# Altium footprint library ic.PcbLib: 106 footprints (part 5 of 7)
Each footprint in its own frame and in the unit in brackets; x right, y up, seen from the top. Pads: shape width x height; smd on the part's side, far side on the other; paste and mask are expansions set on the pad; w line width, h text height; cw(c..) or ccw(c..) is an arc to the next point about the centre after c.
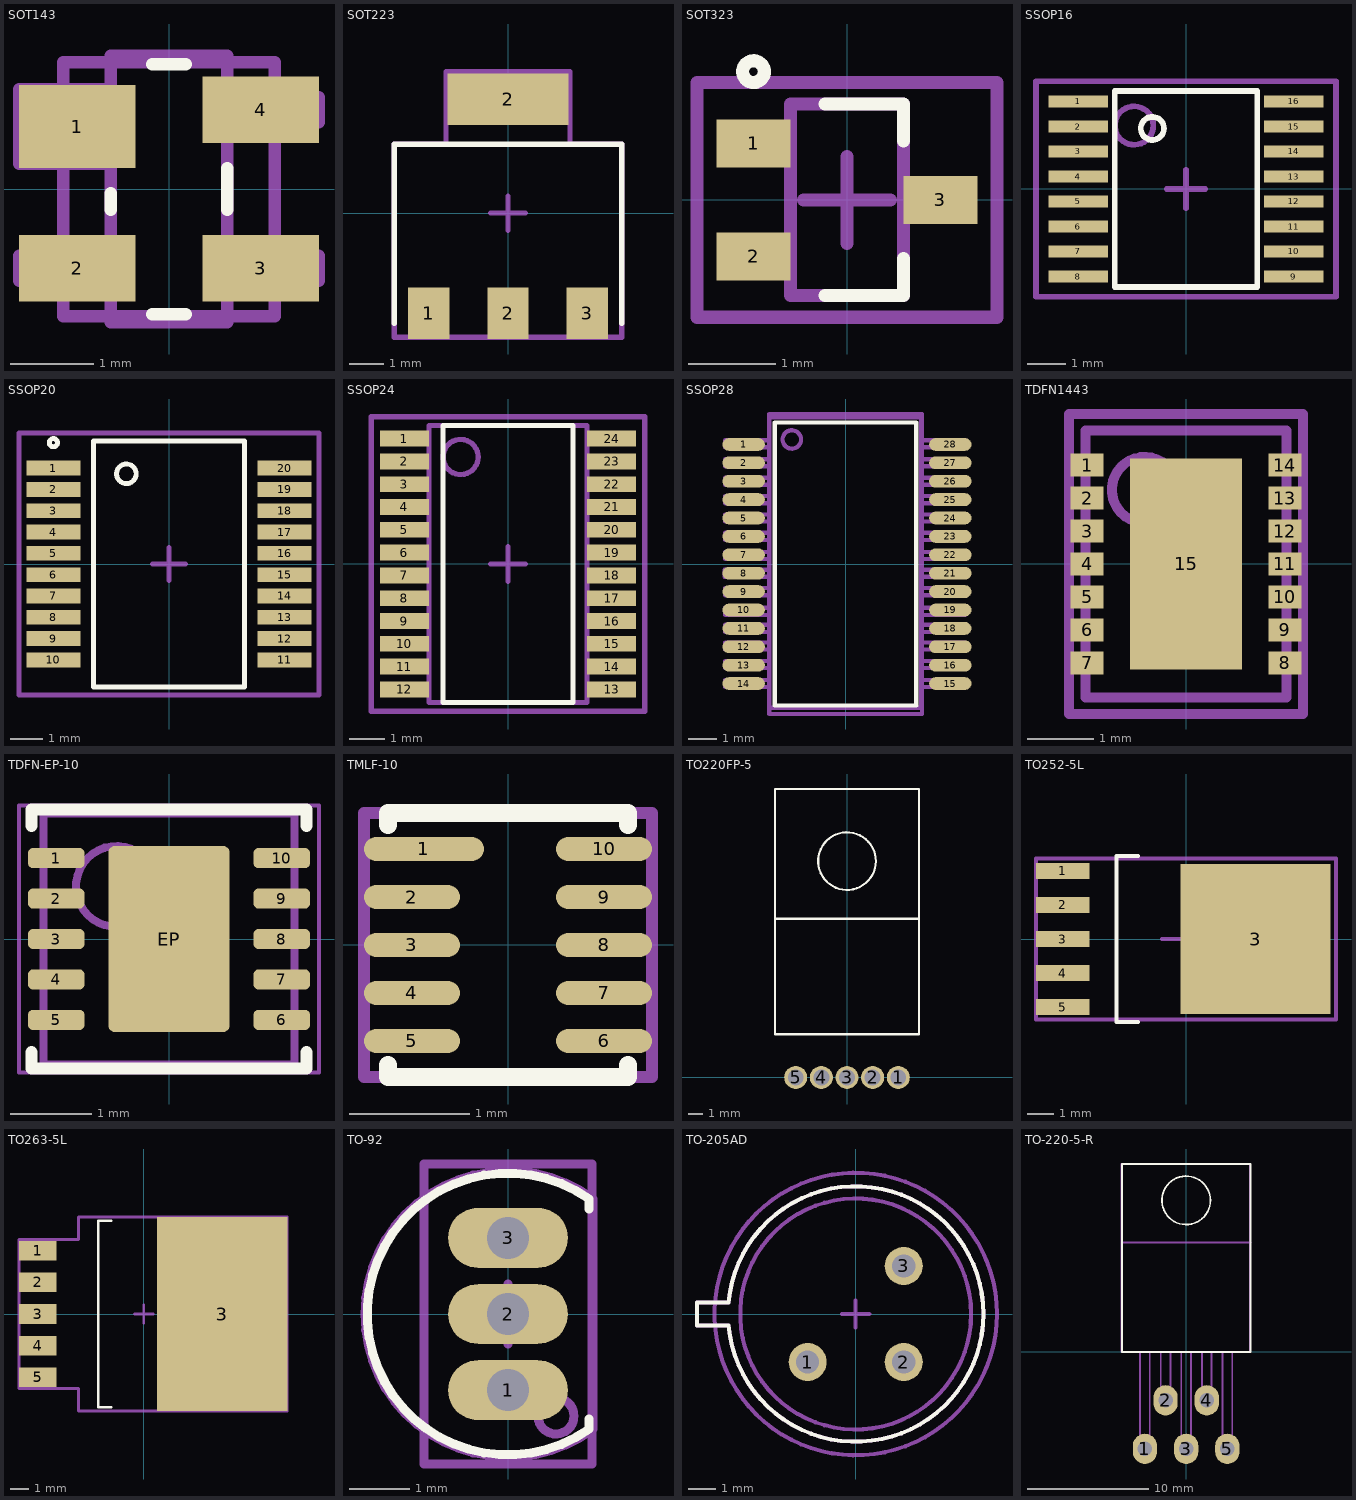
[diagram p4: the footprints below, top view; thin cyan lines are the x and y axes]

## SOT143 [mm] "SOT143, 4-Leads, Body 2,92x2,37mm, Pitch 1,90mm, IPC High Density"
height 1.2
pads (4):
  rect 1.4x1 smd: 1(-1.1,0.75)
  rect 1.4x0.8 smd: 2(-1.1,-0.95) 3(1.1,-0.95) 4(1.1,0.95)
Top Overlay:
  lines w0.15: -0.7,-0.25 -0.7,-0.05 ; -0.2,-1.5 0.2,-1.5 ; -0.2,1.5 0.2,1.5 ; 0.7,-0.25 0.7,0.25
  text "." at -1.651,1.816 h0.1
Top Courtyard:
  lines w0.15: -1.27,-1.524 1.27,-1.524 1.27,1.524 -1.27,1.524 -1.27,-1.524
Mechanical 29:
  lines w0.15: -0.7,-1.1 -1.8,-1.1 -1.8,-0.8 -0.7,-0.8 ; -0.7,0.3 -1.8,0.3 -1.8,1.2 -0.7,1.2 ; 0.7,-1.1 1.8,-1.1 1.8,-0.8 0.7,-0.8 ; 0.7,0.8 1.8,0.8 1.8,1.1 0.7,1.1 ; -0.7,-1.6 0.7,-1.6 0.7,1.6 -0.7,1.6 -0.7,-1.6
  text ".Designator" at -1.8,2 h1
3D body "SOT143.step": height 1.2, standoff 0.01, extent -1.179,-1.52 1.179,1.52

## SOT223 [mm]
pads (4):
  rect 1.2x1.5 smd: 1(-2.3,-2.9) 2(0,-2.9) 3(2.3,-2.9)
  rect 3.5x1.5 smd: 2(0,3.3)
Top Overlay:
  lines w0.15: -3.3,-3.2 -3.3,2 0,2 3.3,2 3.3,-3.2
  text "." at -3.6,-3.7 h0.1
Top Courtyard:
  lines w0.15: -0.5,0 0.5,0 ; 0,-0.5 0,0.5 ; -3.3,-3.6 3.3,-3.6 3.3,-2.6 3.3,2 1.8,2 1.8,4.1 -1.8,4.1 -1.8,2 -3.3,2 -3.3,-3.6
3D body "SW3dPS-SOT-223-1.STEP": height 1.64, standoff -0.01, extent -3.25,-3.398 3.25,3.602

## SOT323 [mm] "SOT323, 3-Leads, Body 2,00x2,10mm, Pitch 0,65mm, IPC Medium Density"
height 1.1
pads (3):
  rect 0.85x0.55 smd: 1(-1.075,0.65) 2(-1.075,-0.65) 3(1.075,0)
Top Overlay:
  circle w0.15: c-1.075,1.475 r0.125
  lines w0.15: -0.25,-1.1 0.65,-1.1 0.65,-0.675 ; -0.25,1.1 0.65,1.1 0.65,0.675
Top Courtyard:
  lines w0.15: -0.5,0 0.5,0 ; 0,-0.5 0,0.5 ; -1.725,-1.35 1.725,-1.35 1.725,1.35 -1.725,1.35 -1.725,-1.35
Mechanical 13:
  lines w0.15: -0.65,-1.1 0.65,-1.1 0.65,1.1 -0.65,1.1 -0.65,-1.1
3D body: height 1.1, standoff 0.1, extent -0.65,-1.1 0.65,1.1

## SSOP16 [mm]
height 1.2
pads (16):
  rect 1.55x0.3 smd: 1(-2.8,2.275) 2(-2.8,1.625) 3(-2.8,0.975) 4(-2.8,0.325) 5(-2.8,-0.325) 6(-2.8,-0.975) 7(-2.8,-1.625) 8(-2.8,-2.275) 9(2.8,-2.275) 10(2.8,-1.625) 11(2.8,-0.975) 12(2.8,-0.325) 13(2.8,0.325) 14(2.8,0.975) 15(2.8,1.625) 16(2.8,2.275)
Top Overlay:
  circle w0.15: c-0.875,1.575 r0.3
  lines w0.15: -1.85,-2.55 -1.85,2.55 1.85,2.55 1.85,-2.55 -1.85,-2.55
  text "." at -2.8,2.9 h0.1
Top Courtyard:
  lines w0.15: -0.5,0 0.5,0 ; 0,-0.5 0,0.5 ; -3.9,-2.8 -3.9,2.8 3.9,2.8 3.9,-2.8 -3.9,-2.8
Mechanical 13:
  circle w0.15: c-1.35,1.65 r0.5

## SSOP20 [mm] "SOP, 20-Leads, Body 7,20x5,29mm, Pitch 0,65mm, IPC Medium Density"
height 1.98
pads (20):
  rect 1.65x0.45 smd: 1(-3.525,2.925) 2(-3.525,2.275) 3(-3.525,1.625) 4(-3.525,0.975) 5(-3.525,0.325) 6(-3.525,-0.325) 7(-3.525,-0.975) 8(-3.525,-1.625) 9(-3.525,-2.275) 10(-3.525,-2.925) 11(3.525,-2.925) 12(3.525,-2.275) 13(3.525,-1.625) 14(3.525,-0.975) 15(3.525,-0.325) 16(3.525,0.325) 17(3.525,0.975) 18(3.525,1.625) 19(3.525,2.275) 20(3.525,2.925)
Top Overlay:
  circle w0.15: c-3.525,3.7 r0.125
  circle w0.15: c-1.3,2.75 r0.3
  lines w0.15: -2.3,-3.75 -2.3,3.75 2.3,3.75 2.3,-3.75 -2.3,-3.75
Top Courtyard:
  lines w0.15: -0.5,0 0.5,0 ; 0,-0.5 0,0.5 ; -4.575,-4 -4.575,4 4.575,4 4.575,-4 -4.575,-4
3D body "TSOP65P650X125-20N.step": height 1.25, standoff 0, extent -3.25,-3.25 3.25,3.25

## SSOP24 [mm] "TSOP, 24-Leads, Body 7,80x4,40mm, Pitch 0,65mm, IPC Medium Density"
height 1.1
pads (24):
  rect 1.4x0.45 smd: 1(-2.95,3.575) 2(-2.95,2.925) 3(-2.95,2.275) 4(-2.95,1.625) 5(-2.95,0.975) 6(-2.95,0.325) 7(-2.95,-0.325) 8(-2.95,-0.975) 9(-2.95,-1.625) 10(-2.95,-2.275) 11(-2.95,-2.925) 12(-2.95,-3.575) 13(2.95,-3.575) 14(2.95,-2.925) 15(2.95,-2.275) 16(2.95,-1.625) 17(2.95,-0.975) 18(2.95,-0.325) 19(2.95,0.325) 20(2.95,0.975) 21(2.95,1.625) 22(2.95,2.275) 23(2.95,2.925) 24(2.95,3.575)
Top Overlay:
  lines w0.15: -1.85,-3.95 -1.85,3.95 1.85,3.95 1.85,-3.95 -1.85,-3.95
  text "." at -3,4.3 h0.1
Top Courtyard:
  lines w0.15: -0.5,0 0.5,0 ; 0,-0.5 0,0.5 ; -3.9,-4.2 -3.9,4.2 3.9,4.2 3.9,-4.2 -3.9,-4.2
Mechanical 29:
  circle w0.15: c-1.35,3.05 r0.5
  lines w0.15: -2.25,-3.7 -3.5,-3.7 -3.5,-3.5 -2.25,-3.5 ; -2.25,-3 -3.5,-3 -3.5,-2.8 -2.25,-2.8 ; -2.25,-2.4 -3.5,-2.4 -3.5,-2.2 -2.25,-2.2 ; -2.25,-1.7 -3.5,-1.7 -3.5,-1.5 -2.25,-1.5 ; -2.25,-1.1 -3.5,-1.1 -3.5,-0.9 -2.25,-0.9 ; -2.25,-0.4 -3.5,-0.4 -3.5,-0.2 -2.25,-0.2 ; -2.25,0.2 -3.5,0.2 -3.5,0.4 -2.25,0.4 ; -2.25,0.9 -3.5,0.9 -3.5,1.1 -2.25,1.1 ; -2.25,1.5 -3.5,1.5 -3.5,1.7 -2.25,1.7 ; -2.25,2.2 -3.5,2.2 -3.5,2.4 -2.25,2.4 ; -2.25,2.8 -3.5,2.8 -3.5,3 -2.25,3 ; -2.25,3.5 -3.5,3.5 -3.5,3.7 -2.25,3.7 ; 2.25,-3.7 3.5,-3.7 3.5,-3.5 2.25,-3.5 ; 2.25,-3 3.5,-3 3.5,-2.8 2.25,-2.8 ; 2.25,-2.4 3.5,-2.4 3.5,-2.2 2.25,-2.2 ; 2.25,-1.7 3.5,-1.7 3.5,-1.5 2.25,-1.5 ; 2.25,-1.1 3.5,-1.1 3.5,-0.9 2.25,-0.9 ; 2.25,-0.4 3.5,-0.4 3.5,-0.2 2.25,-0.2 ; 2.25,0.2 3.5,0.2 3.5,0.4 2.25,0.4 ; 2.25,0.9 3.5,0.9 3.5,1.1 2.25,1.1 ; 2.25,1.5 3.5,1.5 3.5,1.7 2.25,1.7 ; 2.25,2.2 3.5,2.2 3.5,2.4 2.25,2.4 ; 2.25,2.8 3.5,2.8 3.5,3 2.25,3 ; 2.25,3.5 3.5,3.5 3.5,3.7 2.25,3.7 ; -2.25,-3.95 -2.25,3.95 2.25,3.95 2.25,-3.95 -2.25,-3.95
  text ".Designator" at -2,-0.4 h1

## SSOP28 [mm] "SOP, 28-Leads, Body 10.2x5.3mm, Pitch 0.65mm, IPC Medium Density"
height 1.99
pads (28):
  oval 1.5x0.45 smd: 1(-3.6,4.225) 2(-3.6,3.575) 3(-3.6,2.925) 4(-3.6,2.275) 5(-3.6,1.625) 6(-3.6,0.975) 7(-3.6,0.325) 8(-3.6,-0.325) 9(-3.6,-0.975) 10(-3.6,-1.625) 11(-3.6,-2.275) 12(-3.6,-2.925) 13(-3.6,-3.575) 14(-3.6,-4.225) 15(3.7,-4.225) 16(3.7,-3.575) 17(3.7,-2.925) 18(3.7,-2.275) 19(3.7,-1.625) 20(3.7,-0.975) 21(3.7,-0.325) 22(3.7,0.325) 23(3.7,0.975) 24(3.7,1.625) 25(3.7,2.275) 26(3.7,2.925) 27(3.7,3.575) 28(3.7,4.225)
Top Overlay:
  lines w0.15: -2.5,-5 -2.5,5 2.5,5 2.5,-5 -2.5,-5
  text "." at -3.9,4.9 h0.1
Mechanical 29:
  circle w0.15: c-1.9,4.4 r0.326
  lines w0.15: -2.725,-0.425 -2.725,-0.45 -4.275,-0.45 -4.275,-0.2 -2.725,-0.2 ; -2.7,-4.325 -2.7,-4.35 -4.25,-4.35 -4.25,-4.1 -2.7,-4.1 ; -2.7,-3.65 -2.7,-3.675 -4.25,-3.675 -4.25,-3.425 -2.7,-3.425 ; -2.7,-3 -2.7,-3.025 -4.25,-3.025 -4.25,-2.775 -2.7,-2.775 ; -2.7,-2.375 -2.7,-2.4 -4.25,-2.4 -4.25,-2.15 -2.7,-2.15 ; -2.7,-1.775 -2.7,-1.8 -4.25,-1.8 -4.25,-1.55 -2.7,-1.55 ; -2.7,-1.075 -2.7,-1.1 -4.25,-1.1 -4.25,-0.85 -2.7,-0.85 ; -2.7,0.2 -2.7,0.175 -4.25,0.175 -4.25,0.425 -2.7,0.425 ; -2.7,0.875 -2.7,0.85 -4.25,0.85 -4.25,1.1 -2.7,1.1 ; -2.7,1.525 -2.7,1.5 -4.25,1.5 -4.25,1.75 -2.7,1.75 ; -2.7,2.175 -2.7,2.15 -4.25,2.15 -4.25,2.4 -2.7,2.4 ; -2.7,2.825 -2.7,2.8 -4.25,2.8 -4.25,3.05 -2.7,3.05 ; -2.7,3.475 -2.7,3.45 -4.25,3.45 -4.25,3.7 -2.7,3.7 ; -2.7,4.15 -2.7,4.125 -4.25,4.125 -4.25,4.375 -2.7,4.375 ; 2.675,-4.325 2.675,-4.35 4.225,-4.35 4.225,-4.1 2.675,-4.1 ; 2.675,-3.65 2.675,-3.675 4.225,-3.675 4.225,-3.425 2.675,-3.425 ; 2.675,-3 2.675,-3.025 4.225,-3.025 4.225,-2.775 2.675,-2.775 ; 2.675,-2.375 2.675,-2.4 4.225,-2.4 4.225,-2.15 2.675,-2.15 ; 2.675,-1.775 2.675,-1.8 4.225,-1.8 4.225,-1.55 2.675,-1.55 ; 2.675,-1.075 2.675,-1.1 4.225,-1.1 4.225,-0.85 2.675,-0.85 ; 2.675,0.2 2.675,0.175 4.225,0.175 4.225,0.425 2.675,0.425 ; 2.675,0.875 2.675,0.85 4.225,0.85 4.225,1.1 2.675,1.1 ; 2.675,1.525 2.675,1.5 4.225,1.5 4.225,1.75 2.675,1.75 ; 2.675,2.175 2.675,2.15 4.225,2.15 4.225,2.4 2.675,2.4 ; 2.675,2.825 2.675,2.8 4.225,2.8 4.225,3.05 2.675,3.05 ; 2.675,3.475 2.675,3.45 4.225,3.45 4.225,3.7 2.675,3.7 ; 2.675,4.15 2.675,4.125 4.225,4.125 4.225,4.375 2.675,4.375 ; 2.7,-0.425 2.7,-0.45 4.25,-0.45 4.25,-0.2 2.7,-0.2 ; -2.7,-5.3 -2.7,5.3 2.7,5.3 2.7,-5.3 -2.7,-5.3 ; -2.7,-5.075 -2.7,5.175 2.675,5.175 2.675,-5.075 -2.7,-5.075
  text ".Designator" at -2.4,-0.3 h1
3D body "User Library-SSOP-28-FT232RL.STEP": height 2.15, standoff 0, extent -3.878,-5.165 3.878,5.165

## TDFN1443 [mm] "TDFN, 14-Leads, Body 3,00x4,00mm, Pitch 0,50mm, Thermal Pad 1,70x3,20mm, IPC Medium Density"
height 0.7
pads (15):
  rect 0.5x0.35 smd: 1(-1.5,1.5) 2(-1.5,1) 3(-1.5,0.5) 4(-1.5,0) 5(-1.5,-0.5) 6(-1.5,-1) 7(-1.5,-1.5) 8(1.5,-1.5) 9(1.5,-1) 10(1.5,-0.5) 11(1.5,0) 12(1.5,0.5) 13(1.5,1) 14(1.5,1.5)
  rect 1.7x3.2 smd: 15(0,0)
Top Overlay:
  text "." at -1.501,2.188 h0.1
Top Courtyard:
  lines w0.15: -0.5,0 0.5,0 ; 0,-0.5 0,0.5 ; -1.775,-2.275 -1.775,2.275 1.775,2.275 1.775,-2.275 -1.775,-2.275
Mechanical 29:
  circle w0.15: c-0.625,1.125 r0.5
  lines w0.15: -1.525,-2.025 -1.525,2.025 1.525,2.025 1.525,-2.025 -1.525,-2.025
  text ".Designator" at -1.9,2.5 h1
3D body: height 0.7, standoff 0, extent -1.525,-2.025 1.525,2.025

## TDFN-EP-10 [mm] "SON, 10-Leads, Body 3,00x3,00mm, Pitch 0,50mm, Thermal Pad 2,30x1,50mm, IPC High Density"
height 0.8
pads (11):
  rrect50% 0.7x0.25 smd: 1(-1.395,1) 2(-1.395,0.5) 3(-1.395,0) 4(-1.395,-0.5) 5(-1.395,-1) 6(1.395,-1) 7(1.395,-0.5) 8(1.395,0) 9(1.395,0.5) 10(1.395,1)
  rrect10% 1.5x2.3 smd: EP(0,0)
Top Overlay:
  lines w0.15: -1.7,-1.4 -1.7,-1.6 1.7,-1.6 1.7,-1.4 ; -1.7,1.4 -1.7,1.6 1.7,1.6 1.7,1.4
  text "." at -2.2,1.4 h0.1
Top Courtyard:
  lines w0.05: -1.855,-1.65 1.855,-1.65 1.855,1.65 -1.855,1.65 -1.855,-1.65
  lines w0.1: -0.5,0 0.5,0 ; 0,-0.5 0,0.5
Top Assembly:
  circle w0.1: c-0.65,0.65 r0.5
  lines w0.1: -1.55,-1.55 1.55,-1.55 1.55,1.55 -1.55,1.55 -1.55,-1.55
3D body "TDFN-EP-10.step": height 0.8, standoff 0, extent -1.55,-1.55 1.55,1.55

## TMLF-10 [mm] "10-Pin 2mm x 2mm Thin MLF®   (MT)"
height 0.6
pads (10):
  oval 1x0.2 smd: 1(-0.7,0.8)
  oval 0.8x0.2 smd: 2(-0.8,0.4) 3(-0.8,0) 4(-0.8,-0.4) 5(-0.8,-0.8) 6(0.8,-0.8) 7(0.8,-0.4) 8(0.8,0) 9(0.8,0.4) 10(0.8,0.8)
Top Overlay:
  lines w0.15: -1,-1 -1,-1.1 1,-1.1 1,-1 ; -1,1 -1,1.1 1,1.1 1,1
  text "." at -1.3,1.3 h0.1
Top Courtyard:
  lines w0.1: -1.2,-1.1 1.2,-1.1 1.2,1.1 -1.2,1.1 -1.2,-1.1
3D body: height 0.55, standoff 0.05, extent -1,-1 1,1

## TO220FP-5 [mm]
pads (5):
  round 1.6 hole 1.1: 1(3.556,0) 2(1.778,0) 3(0,0) 4(-1.778,0) 5(-3.556,0)
Top Overlay:
  circle w0.15: c0,15 r2
  lines w0.15: -5,11 5,11 ; -5,3 5,3 5,20 -5,20 -5,3
3D body "[ic,fet] TO220-5.stp": height 5, standoff -3.5, extent -5,-0.25 5,20

## TO252-5L [mm] "D2-PAK, 6-Pads, Body 7,35x8,36mm (max), IPC Medium Density"
height 3
pads (6):
  rect 2x0.6 smd: 1(-4.6,2.54) 2(-4.6,1.27) 3(-4.6,0) 4(-4.6,-1.27) 5(-4.6,-2.54)
  rect 5.6x5.6 smd: 3(2.6,0)
Top Overlay:
  lines w0.15: -1.8,-3.1 -2.6,-3.1 -2.6,3.1 -1.8,3.1
  text "." at -4.655,3.559 h0.1
Top Courtyard:
  lines w0.15: -0.9,0 0,0 ; 0,-0.9 0,0 ; 0,0.9 0,0 ; 0.9,0 0,0 ; -5.6,-3 5.6,-3 5.6,3 -5.6,3 -5.6,-3
3D body: height 4.6, standoff 0, extent -5.9,-3.1 5.6,3.1

## TO263-5L [mm] "D2-PAK, 6-Pads, Body 7,35x8,36mm (max), IPC Medium Density"
height 4.6
pads (6):
  rect 2x1.05 smd: 1(-5.7,3.4) 2(-5.7,1.7) 3(-5.7,0) 4(-5.7,-1.7) 5(-5.7,-3.4)
  rect 7x10.4 smd: 3(4.2,0)
Top Overlay:
  lines w0.15: -1.75,-5 -2.45,-5 -2.45,5 -1.75,5
  text "." at -6.055,4.459 h0.1
Top Courtyard:
  lines w0.15: -0.5,0 0.5,0 ; 0,-0.5 0,0.5 ; -6.7,-4 -6.7,1.2 -6.7,4 -3.5,4 -3.5,5.2 7.7,5.2 7.7,0 7.7,-5.2 -3.5,-5.2 -3.5,-4 -6.7,-4
3D body "TO263-5L.step": height 4.6, standoff 0, extent -6.665,-5.05 7.685,5.05

## TO-92 [mm] "TO, Flat Index; 3 In-Line, Axial Leads; Body Dia. 4.6mm; Leads 0.41 x 0.39 mm (max)"
height 4.7
pads (3):
  oval 2x1 hole 0.7: 1(0,-1.27) 2(0,0) 3(0,1.27)
Top Overlay:
  lines w0.15: 1.35,-1.75 1.35,-1.92 cw(c0,0) 1.35,1.92 1.35,1.75
  text "." at 1.6,-1.3 h0.1
Top Courtyard:
  lines w0.15: -0.5,0 0.5,0 ; 0,-0.5 0,0.5 ; -1.4,-2.5 0,-2.5 1.4,-2.5 1.4,0 1.4,2.5 0,2.5 -1.4,2.5 -1.4,0 -1.4,-2.5
Mechanical 29:
  circle w0.15: c0.8,-1.7 r0.3
  lines w0.15: 1.415,-1.92 cw(c0,0) 1.415,1.92 1.415,-1.92
  text ".Designator" at -2.2,-0.3 h1
3D body "TO-92.STEP": height 7, standoff -3, extent -2.5,-2.499 1.501,2.499

## TO-205AD [mm]
height 10.1
pads (3):
  round 1.4 hole 0.85: 1(-1.768,-1.768) 2(1.768,-1.768) 3(1.768,1.768)
Top Overlay:
  lines w0.15: -5.84,-0.43 -5.84,0.43 -4.68,0.43 cw(c0,0) -4.68,-0.431 -5.84,-0.43
Top Courtyard:
  lines w0.15: -0.5,0 0.5,0 ; 0,-0.5 0,0.5
M15:
  circle w0.15: c0,0 r5.2
Mechanical 29:
  circle w0.15: c0,0 r4.25
  lines w0.15: -5.84,-0.43 -5.84,0.43 -4.68,0.43 cw(c0,0) -4.68,-0.431 -5.84,-0.43
  text ".Designator" at -3.3,-0.3 h1
3D body "TO-39.STEP": height 10.1, standoff -8.32, extent -6.645,-6.645 6.647,6.647

## TO-220-5-R [mm]
height 5
pads (5):
  oval 2x2.5 hole 1.2: 1(-3.4,-8) 2(-1.7,-4) 3(0,-8) 4(1.7,-4) 5(3.4,-8)
Top Overlay:
  circle w0.15: c0,12.5 r2
  lines w0.15: -5.3,0 5.3,0 5.3,15.5 -5.3,15.5 -5.3,0
Mechanical 29:
  lines w0.15: -5.35,9.025 5.325,9.025 ; -3.8,0 -3.8,-8 -3,-8 -3,0 ; -2.1,0 -2.1,-4 -1.3,-4 -1.3,0 ; -0.4,0 -0.4,-8 0.4,-8 0.4,0 ; 1.3,0 1.3,-4 2.1,-4 2.1,0 ; 3,0 3,-8 3.8,-8 3.8,0 ; -5.35,0 -5.35,15.5 5.275,15.5 5.275,0 -5.35,0
  text ".Designator" at -3.3,2.4 h1